# Altium schematic symbol library jlcpcb_2025_04_capacitors_extended_0603.schlib: 3668 symbols (part 20 of 20) (continued)
## TCC0603X7R472K251CT
designator C?  Capacitance: 4700pF  (hidden comment: *)
Capacitor, Ceramic (MLCC), 4700pF, ±10%, 250V, X7R, ±10%, SMD 0603; Manufacturer: CCTC; Manufacturer Part Number: TCC0603X7R472K251CT; Package Size: 0603; JLCPCB Basic Part: No; JLCPCB Part Number: C5375795; Supplier 1: LCSC; Category: Capacitors - MLCC; Supplier Part Number 1: C5375795; Tolerance: ±10%; Voltage Rating: 250V; Temperature Coefficient: X7R; RoHS: Yes; ComponentLink1Description: Datasheet; ComponentLink1URL: https://wmsc.lcsc.com/wmsc/upload/file/pdf/v2/lcsc/2403281708_CCTC-TCC0603X7R472K251CT_C5375795.pdf; ComponentLink2Description: JLCPCB Part URL; ComponentLink2URL: https://jlcpcb.com/partdetail/C5375795; ComponentLink3Description: LCSC Part URL; ComponentLink3URL: https://lcsc.com/product-detail/Multilayer-Ceramic-Capacitors-MLCC---SMD-SMT_CCTC-CCTC-TCC0603X7R472K251CT_C5375795.html
footprint CAP-0603 (0603 (1608M) Capacitor)
pins: 1, 2

## TCC0603X7R472K500CT
designator C?  Capacitance: 4.7nF  (hidden comment: *)
Capacitor, Ceramic (MLCC), 4.7nF, ±10%, 50V, X7R, ±10%, SMD 0603; Manufacturer: CCTC; Manufacturer Part Number: TCC0603X7R472K500CT; Package Size: 0603; JLCPCB Basic Part: No; JLCPCB Part Number: C376837; Supplier 1: LCSC; Category: Capacitors - MLCC; Supplier Part Number 1: C376837; Tolerance: ±10%; Voltage Rating: 50V; Temperature Coefficient: X7R; RoHS: Yes; ComponentLink1Description: Datasheet; ComponentLink1URL: https://wmsc.lcsc.com/wmsc/upload/file/pdf/v2/lcsc/2304140030_CCTC-TCC0603X7R472K500CT_C376837.pdf; ComponentLink2Description: JLCPCB Part URL; ComponentLink2URL: https://jlcpcb.com/partdetail/C376837; ComponentLink3Description: LCSC Part URL; ComponentLink3URL: https://lcsc.com/product-detail/Multilayer-Ceramic-Capacitors-MLCC---SMD-SMT_CCTC-CCTC-TCC0603X7R472K500CT_C376837.html
footprint CAP-0603 (0603 (1608M) Capacitor)
pins: 1, 2

## TCC0603X7R472M500CT
designator C?  Capacitance: 4.7nF  (hidden comment: *)
Capacitor, Ceramic (MLCC), 4.7nF, ±20%, 50V, X7R, ±20%, SMD 0603; Manufacturer: CCTC; Manufacturer Part Number: TCC0603X7R472M500CT; Package Size: 0603; JLCPCB Basic Part: No; JLCPCB Part Number: C696859; Supplier 1: LCSC; Category: Capacitors - MLCC; Supplier Part Number 1: C696859; Tolerance: ±20%; Voltage Rating: 50V; Temperature Coefficient: X7R; RoHS: Yes; ComponentLink1Description: Datasheet; ComponentLink1URL: https://wmsc.lcsc.com/wmsc/upload/file/pdf/v2/lcsc/2304140030_CCTC-TCC0603X7R472M500CT_C696859.pdf; ComponentLink2Description: JLCPCB Part URL; ComponentLink2URL: https://jlcpcb.com/partdetail/C696859; ComponentLink3Description: LCSC Part URL; ComponentLink3URL: https://lcsc.com/product-detail/Multilayer-Ceramic-Capacitors-MLCC---SMD-SMT_CCTC-CCTC-TCC0603X7R472M500CT_C696859.html
footprint CAP-0603 (0603 (1608M) Capacitor)
pins: 1, 2

## TCC0603X7R473K500CT
designator C?  Capacitance: 47nF  (hidden comment: *)
Capacitor, Ceramic (MLCC), 47nF, ±10%, 50V, X7R, ±10%, SMD 0603; Manufacturer: CCTC; Manufacturer Part Number: TCC0603X7R473K500CT; Package Size: 0603; JLCPCB Basic Part: No; JLCPCB Part Number: C282684; Supplier 1: LCSC; Category: Capacitors - MLCC; Supplier Part Number 1: C282684; Tolerance: ±10%; Voltage Rating: 50V; Temperature Coefficient: X7R; RoHS: Yes; ComponentLink1Description: Datasheet; ComponentLink1URL: https://wmsc.lcsc.com/wmsc/upload/file/pdf/v2/lcsc/2304140030_CCTC-TCC0603X7R473K500CT_C282684.pdf; ComponentLink2Description: JLCPCB Part URL; ComponentLink2URL: https://jlcpcb.com/partdetail/C282684; ComponentLink3Description: LCSC Part URL; ComponentLink3URL: https://lcsc.com/product-detail/Multilayer-Ceramic-Capacitors-MLCC---SMD-SMT_CCTC-CCTC-TCC0603X7R473K500CT_C282684.html
footprint CAP-0603 (0603 (1608M) Capacitor)
pins: 1, 2

## TCC0603X7R473M500CT
designator C?  Capacitance: 47nF  (hidden comment: *)
Capacitor, Ceramic (MLCC), 47nF, ±20%, 50V, X7R, ±20%, SMD 0603; Manufacturer: CCTC; Manufacturer Part Number: TCC0603X7R473M500CT; Package Size: 0603; JLCPCB Basic Part: No; JLCPCB Part Number: C696860; Supplier 1: LCSC; Category: Capacitors - MLCC; Supplier Part Number 1: C696860; Tolerance: ±20%; Voltage Rating: 50V; Temperature Coefficient: X7R; RoHS: Yes; ComponentLink1Description: Datasheet; ComponentLink1URL: https://wmsc.lcsc.com/wmsc/upload/file/pdf/v2/lcsc/2304140030_CCTC-TCC0603X7R473M500CT_C696860.pdf; ComponentLink2Description: JLCPCB Part URL; ComponentLink2URL: https://jlcpcb.com/partdetail/C696860; ComponentLink3Description: LCSC Part URL; ComponentLink3URL: https://lcsc.com/product-detail/Multilayer-Ceramic-Capacitors-MLCC---SMD-SMT_CCTC-CCTC-TCC0603X7R473M500CT_C696860.html
footprint CAP-0603 (0603 (1608M) Capacitor)
pins: 1, 2

## TCC0603X7R473M500CTS
designator C?  Capacitance: 47nF  (hidden comment: *)
Capacitor, Ceramic (MLCC), 47nF, ±20%, 50V, X7R, ±20%, SMD 0603; Manufacturer: CCTC; Manufacturer Part Number: TCC0603X7R473M500CTS; Package Size: 0603; JLCPCB Basic Part: No; JLCPCB Part Number: C7393907; Supplier 1: LCSC; Category: Capacitors - MLCC; Supplier Part Number 1: C7393907; Tolerance: ±20%; Voltage Rating: 50V; Temperature Coefficient: X7R; RoHS: Yes; ComponentLink1Description: Datasheet; ComponentLink1URL: https://wmsc.lcsc.com/wmsc/upload/file/pdf/v2/lcsc/2306211554_CCTC-TCC0603X7R473M500CTS_C7393907.pdf; ComponentLink2Description: JLCPCB Part URL; ComponentLink2URL: https://jlcpcb.com/partdetail/C7393907; ComponentLink3Description: LCSC Part URL; ComponentLink3URL: https://lcsc.com/product-detail/Multilayer-Ceramic-Capacitors-MLCC---SMD-SMT_CCTC-CCTC-TCC0603X7R473M500CTS_C7393907.html
footprint CAP-0603 (0603 (1608M) Capacitor)
pins: 1, 2

## TCC0603X7R474K250CT
designator C?  Capacitance: 470nF  (hidden comment: *)
Capacitor, Ceramic (MLCC), 470nF, ±10%, 25V, X7R, ±10%, SMD 0603; Manufacturer: CCTC; Manufacturer Part Number: TCC0603X7R474K250CT; Package Size: 0603; JLCPCB Basic Part: No; JLCPCB Part Number: C376838; Supplier 1: LCSC; Category: Capacitors - MLCC; Supplier Part Number 1: C376838; Tolerance: ±10%; Voltage Rating: 25V; Temperature Coefficient: X7R; RoHS: Yes; ComponentLink1Description: Datasheet; ComponentLink1URL: https://wmsc.lcsc.com/wmsc/upload/file/pdf/v2/lcsc/2304140030_CCTC-TCC0603X7R474K250CT_C376838.pdf; ComponentLink2Description: JLCPCB Part URL; ComponentLink2URL: https://jlcpcb.com/partdetail/C376838; ComponentLink3Description: LCSC Part URL; ComponentLink3URL: https://lcsc.com/product-detail/Multilayer-Ceramic-Capacitors-MLCC---SMD-SMT_CCTC-CCTC-TCC0603X7R474K250CT_C376838.html
footprint CAP-0603 (0603 (1608M) Capacitor)
pins: 1, 2

## TCC0603X7R474K500CT
designator C?  Capacitance: 470nF  (hidden comment: *)
Capacitor, Ceramic (MLCC), 470nF, ±10%, 50V, X7R, ±10%, SMD 0603; Manufacturer: CCTC; Manufacturer Part Number: TCC0603X7R474K500CT; Package Size: 0603; JLCPCB Basic Part: No; JLCPCB Part Number: C376839; Supplier 1: LCSC; Category: Capacitors - MLCC; Supplier Part Number 1: C376839; Tolerance: ±10%; Voltage Rating: 50V; Temperature Coefficient: X7R; RoHS: Yes; ComponentLink1Description: Datasheet; ComponentLink1URL: https://wmsc.lcsc.com/wmsc/upload/file/pdf/v2/lcsc/2304140030_CCTC-TCC0603X7R474K500CT_C376839.pdf; ComponentLink2Description: JLCPCB Part URL; ComponentLink2URL: https://jlcpcb.com/partdetail/C376839; ComponentLink3Description: LCSC Part URL; ComponentLink3URL: https://lcsc.com/product-detail/Multilayer-Ceramic-Capacitors-MLCC---SMD-SMT_CCTC-CCTC-TCC0603X7R474K500CT_C376839.html
footprint CAP-0603 (0603 (1608M) Capacitor)
pins: 1, 2

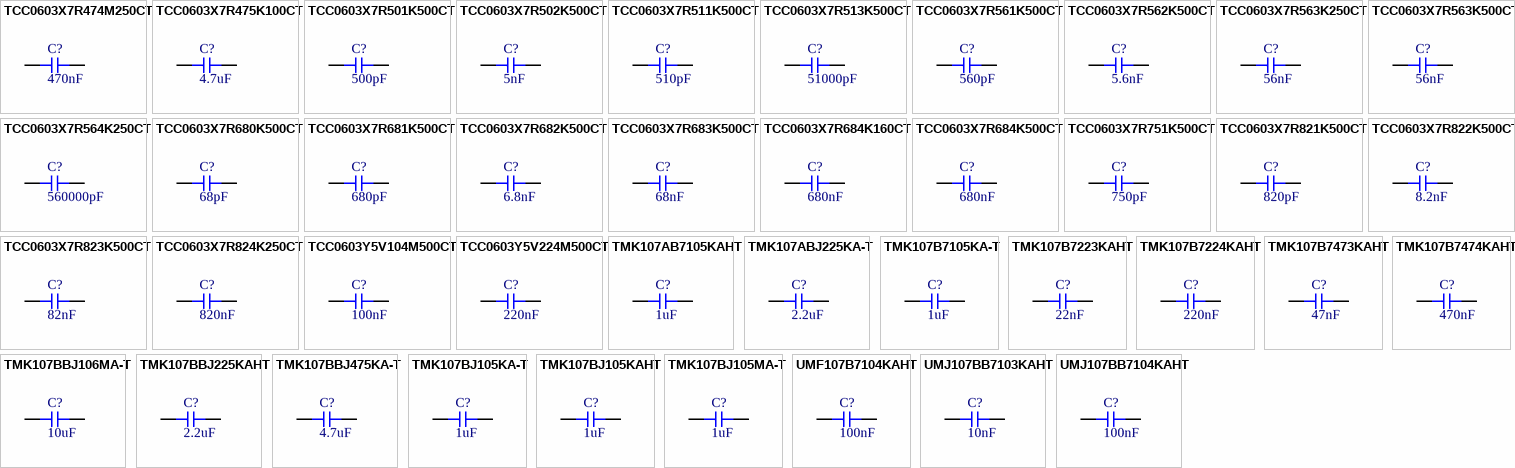
[diagram p89: symbols TCC0603X7R474M250CT to UMJ107BB7104KAHT]

## TCC0603X7R474M250CT
designator C?  Capacitance: 470nF  (hidden comment: *)
Capacitor, Ceramic (MLCC), 470nF, ±20%, 25V, X7R, ±20%, SMD 0603; Manufacturer: CCTC; Manufacturer Part Number: TCC0603X7R474M250CT; Package Size: 0603; JLCPCB Basic Part: No; JLCPCB Part Number: C880617; Supplier 1: LCSC; Category: Capacitors - MLCC; Supplier Part Number 1: C880617; Tolerance: ±20%; Voltage Rating: 25V; Temperature Coefficient: X7R; RoHS: Yes; ComponentLink1Description: Datasheet; ComponentLink1URL: https://wmsc.lcsc.com/wmsc/upload/file/pdf/v2/lcsc/2305171520_CCTC-TCC0603X7R474M250CT_C880617.pdf; ComponentLink2Description: JLCPCB Part URL; ComponentLink2URL: https://jlcpcb.com/partdetail/C880617; ComponentLink3Description: LCSC Part URL; ComponentLink3URL: https://lcsc.com/product-detail/Multilayer-Ceramic-Capacitors-MLCC---SMD-SMT_CCTC-CCTC-TCC0603X7R474M250CT_C880617.html
footprint CAP-0603 (0603 (1608M) Capacitor)
pins: 1, 2

## TCC0603X7R475K100CT
designator C?  Capacitance: 4.7uF  (hidden comment: *)
Capacitor, Ceramic (MLCC), 4.7uF, ±10%, 10V, X7R, ±10%, SMD 0603; Manufacturer: CCTC; Manufacturer Part Number: TCC0603X7R475K100CT; Package Size: 0603; JLCPCB Basic Part: No; JLCPCB Part Number: C18185770; Supplier 1: LCSC; Category: Capacitors - MLCC; Supplier Part Number 1: C18185770; Tolerance: ±10%; Voltage Rating: 10V; Temperature Coefficient: X7R; RoHS: Yes; ComponentLink1Description: Datasheet; ComponentLink1URL: https://wmsc.lcsc.com/wmsc/upload/file/pdf/v2/lcsc/2309181618_CCTC-TCC0603X7R475K100CT_C18185770.pdf; ComponentLink2Description: JLCPCB Part URL; ComponentLink2URL: https://jlcpcb.com/partdetail/C18185770; ComponentLink3Description: LCSC Part URL; ComponentLink3URL: https://lcsc.com/product-detail/Multilayer-Ceramic-Capacitors-MLCC---SMD-SMT_CCTC-CCTC-TCC0603X7R475K100CT_C18185770.html
footprint CAP-0603 (0603 (1608M) Capacitor)
pins: 1, 2

## TCC0603X7R501K500CT
designator C?  Capacitance: 500pF  (hidden comment: *)
Capacitor, Ceramic (MLCC), 500pF, ±10%, 50V, X7R, ±10%, SMD 0603; Manufacturer: CCTC; Manufacturer Part Number: TCC0603X7R501K500CT; Package Size: 0603; JLCPCB Basic Part: No; JLCPCB Part Number: C696904; Supplier 1: LCSC; Category: Capacitors - MLCC; Supplier Part Number 1: C696904; Tolerance: ±10%; Voltage Rating: 50V; Temperature Coefficient: X7R; RoHS: Yes; ComponentLink1Description: Datasheet; ComponentLink1URL: https://wmsc.lcsc.com/wmsc/upload/file/pdf/v2/lcsc/2304140030_CCTC-TCC0603X7R501K500CT_C696904.pdf; ComponentLink2Description: JLCPCB Part URL; ComponentLink2URL: https://jlcpcb.com/partdetail/C696904; ComponentLink3Description: LCSC Part URL; ComponentLink3URL: https://lcsc.com/product-detail/Multilayer-Ceramic-Capacitors-MLCC---SMD-SMT_CCTC-CCTC-TCC0603X7R501K500CT_C696904.html
footprint CAP-0603 (0603 (1608M) Capacitor)
pins: 1, 2

## TCC0603X7R502K500CT
designator C?  Capacitance: 5nF  (hidden comment: *)
Capacitor, Ceramic (MLCC), 5nF, ±10%, 50V, X7R, ±10%, SMD 0603; Manufacturer: CCTC; Manufacturer Part Number: TCC0603X7R502K500CT; Package Size: 0603; JLCPCB Basic Part: No; JLCPCB Part Number: C376840; Supplier 1: LCSC; Category: Capacitors - MLCC; Supplier Part Number 1: C376840; Tolerance: ±10%; Voltage Rating: 50V; Temperature Coefficient: X7R; RoHS: Yes; ComponentLink1Description: Datasheet; ComponentLink1URL: https://wmsc.lcsc.com/wmsc/upload/file/pdf/v2/lcsc/2304140030_CCTC-TCC0603X7R502K500CT_C376840.pdf; ComponentLink2Description: JLCPCB Part URL; ComponentLink2URL: https://jlcpcb.com/partdetail/C376840; ComponentLink3Description: LCSC Part URL; ComponentLink3URL: https://lcsc.com/product-detail/Multilayer-Ceramic-Capacitors-MLCC---SMD-SMT_CCTC-CCTC-TCC0603X7R502K500CT_C376840.html
footprint CAP-0603 (0603 (1608M) Capacitor)
pins: 1, 2

## TCC0603X7R511K500CT
designator C?  Capacitance: 510pF  (hidden comment: *)
Capacitor, Ceramic (MLCC), 510pF, ±10%, 50V, X7R, ±10%, SMD 0603; Manufacturer: CCTC; Manufacturer Part Number: TCC0603X7R511K500CT; Package Size: 0603; JLCPCB Basic Part: No; JLCPCB Part Number: C376841; Supplier 1: LCSC; Category: Capacitors - MLCC; Supplier Part Number 1: C376841; Tolerance: ±10%; Voltage Rating: 50V; Temperature Coefficient: X7R; RoHS: Yes; ComponentLink1Description: Datasheet; ComponentLink1URL: https://wmsc.lcsc.com/wmsc/upload/file/pdf/v2/lcsc/2304140030_CCTC-TCC0603X7R511K500CT_C376841.pdf; ComponentLink2Description: JLCPCB Part URL; ComponentLink2URL: https://jlcpcb.com/partdetail/C376841; ComponentLink3Description: LCSC Part URL; ComponentLink3URL: https://lcsc.com/product-detail/Multilayer-Ceramic-Capacitors-MLCC---SMD-SMT_CCTC-CCTC-TCC0603X7R511K500CT_C376841.html
footprint CAP-0603 (0603 (1608M) Capacitor)
pins: 1, 2

## TCC0603X7R513K500CT
designator C?  Capacitance: 51000pF  (hidden comment: *)
Capacitor, Ceramic (MLCC), 51000pF, ±10%, null, X7R, ±10%, SMD 0603; Manufacturer: CCTC; Manufacturer Part Number: TCC0603X7R513K500CT; Package Size: 0603; JLCPCB Basic Part: No; JLCPCB Part Number: C5360806; Supplier 1: LCSC; Category: Capacitors - MLCC; Supplier Part Number 1: C5360806; Tolerance: ±10%; Voltage Rating: null; Temperature Coefficient: X7R; RoHS: Yes; ComponentLink1Description: Datasheet; ComponentLink1URL: https://wmsc.lcsc.com/wmsc/upload/file/pdf/v2/lcsc/2302141837_CCTC-TCC0603X7R513K500CT_C5360806.pdf; ComponentLink2Description: JLCPCB Part URL; ComponentLink2URL: https://jlcpcb.com/partdetail/C5360806; ComponentLink3Description: LCSC Part URL; ComponentLink3URL: https://lcsc.com/product-detail/Multilayer-Ceramic-Capacitors-MLCC---SMD-SMT_CCTC-CCTC-TCC0603X7R513K500CT_C5360806.html
footprint CAP-0603 (0603 (1608M) Capacitor)
pins: 1, 2

## TCC0603X7R561K500CT
designator C?  Capacitance: 560pF  (hidden comment: *)
Capacitor, Ceramic (MLCC), 560pF, ±10%, 50V, X7R, ±10%, SMD 0603; Manufacturer: CCTC; Manufacturer Part Number: TCC0603X7R561K500CT; Package Size: 0603; JLCPCB Basic Part: No; JLCPCB Part Number: C376842; Supplier 1: LCSC; Category: Capacitors - MLCC; Supplier Part Number 1: C376842; Tolerance: ±10%; Voltage Rating: 50V; Temperature Coefficient: X7R; RoHS: Yes; ComponentLink1Description: Datasheet; ComponentLink1URL: https://wmsc.lcsc.com/wmsc/upload/file/pdf/v2/lcsc/2304140030_CCTC-TCC0603X7R561K500CT_C376842.pdf; ComponentLink2Description: JLCPCB Part URL; ComponentLink2URL: https://jlcpcb.com/partdetail/C376842; ComponentLink3Description: LCSC Part URL; ComponentLink3URL: https://lcsc.com/product-detail/Multilayer-Ceramic-Capacitors-MLCC---SMD-SMT_CCTC-CCTC-TCC0603X7R561K500CT_C376842.html
footprint CAP-0603 (0603 (1608M) Capacitor)
pins: 1, 2

## TCC0603X7R562K500CT
designator C?  Capacitance: 5.6nF  (hidden comment: *)
Capacitor, Ceramic (MLCC), 5.6nF, ±10%, 50V, X7R, ±10%, SMD 0603; Manufacturer: CCTC; Manufacturer Part Number: TCC0603X7R562K500CT; Package Size: 0603; JLCPCB Basic Part: No; JLCPCB Part Number: C282685; Supplier 1: LCSC; Category: Capacitors - MLCC; Supplier Part Number 1: C282685; Tolerance: ±10%; Voltage Rating: 50V; Temperature Coefficient: X7R; RoHS: Yes; ComponentLink1Description: Datasheet; ComponentLink1URL: https://wmsc.lcsc.com/wmsc/upload/file/pdf/v2/lcsc/2304140030_CCTC-TCC0603X7R562K500CT_C282685.pdf; ComponentLink2Description: JLCPCB Part URL; ComponentLink2URL: https://jlcpcb.com/partdetail/C282685; ComponentLink3Description: LCSC Part URL; ComponentLink3URL: https://lcsc.com/product-detail/Multilayer-Ceramic-Capacitors-MLCC---SMD-SMT_CCTC-CCTC-TCC0603X7R562K500CT_C282685.html
footprint CAP-0603 (0603 (1608M) Capacitor)
pins: 1, 2

## TCC0603X7R563K250CT
designator C?  Capacitance: 56nF  (hidden comment: *)
Capacitor, Ceramic (MLCC), 56nF, ±10%, 25V, X7R, ±10%, SMD 0603; Manufacturer: CCTC; Manufacturer Part Number: TCC0603X7R563K250CT; Package Size: 0603; JLCPCB Basic Part: No; JLCPCB Part Number: C376844; Supplier 1: LCSC; Category: Capacitors - MLCC; Supplier Part Number 1: C376844; Tolerance: ±10%; Voltage Rating: 25V; Temperature Coefficient: X7R; RoHS: Yes; ComponentLink1Description: Datasheet; ComponentLink1URL: https://wmsc.lcsc.com/wmsc/upload/file/pdf/v2/lcsc/2304140030_CCTC-TCC0603X7R563K250CT_C376844.pdf; ComponentLink2Description: JLCPCB Part URL; ComponentLink2URL: https://jlcpcb.com/partdetail/C376844; ComponentLink3Description: LCSC Part URL; ComponentLink3URL: https://lcsc.com/product-detail/Multilayer-Ceramic-Capacitors-MLCC---SMD-SMT_CCTC-CCTC-TCC0603X7R563K250CT_C376844.html
footprint CAP-0603 (0603 (1608M) Capacitor)
pins: 1, 2

## TCC0603X7R563K500CT
designator C?  Capacitance: 56nF  (hidden comment: *)
Capacitor, Ceramic (MLCC), 56nF, ±10%, 50V, X7R, ±10%, SMD 0603; Manufacturer: CCTC; Manufacturer Part Number: TCC0603X7R563K500CT; Package Size: 0603; JLCPCB Basic Part: No; JLCPCB Part Number: C309032; Supplier 1: LCSC; Category: Capacitors - MLCC; Supplier Part Number 1: C309032; Tolerance: ±10%; Voltage Rating: 50V; Temperature Coefficient: X7R; RoHS: Yes; ComponentLink1Description: Datasheet; ComponentLink1URL: https://wmsc.lcsc.com/wmsc/upload/file/pdf/v2/lcsc/2304140030_CCTC-TCC0603X7R563K500CT_C309032.pdf; ComponentLink2Description: JLCPCB Part URL; ComponentLink2URL: https://jlcpcb.com/partdetail/C309032; ComponentLink3Description: LCSC Part URL; ComponentLink3URL: https://lcsc.com/product-detail/Multilayer-Ceramic-Capacitors-MLCC---SMD-SMT_CCTC-CCTC-TCC0603X7R563K500CT_C309032.html
footprint CAP-0603 (0603 (1608M) Capacitor)
pins: 1, 2

## TCC0603X7R564K250CT
designator C?  Capacitance: 560000pF  (hidden comment: *)
Capacitor, Ceramic (MLCC), 560000pF, ±10%, 25V, X7R, ±10%, SMD 0603; Manufacturer: CCTC; Manufacturer Part Number: TCC0603X7R564K250CT; Package Size: 0603; JLCPCB Basic Part: No; JLCPCB Part Number: C5360809; Supplier 1: LCSC; Category: Capacitors - MLCC; Supplier Part Number 1: C5360809; Tolerance: ±10%; Voltage Rating: 25V; Temperature Coefficient: X7R; RoHS: Yes; ComponentLink1Description: Datasheet; ComponentLink1URL: https://wmsc.lcsc.com/wmsc/upload/file/pdf/v2/lcsc/2302141837_CCTC-TCC0603X7R564K250CT_C5360809.pdf; ComponentLink2Description: JLCPCB Part URL; ComponentLink2URL: https://jlcpcb.com/partdetail/C5360809; ComponentLink3Description: LCSC Part URL; ComponentLink3URL: https://lcsc.com/product-detail/Multilayer-Ceramic-Capacitors-MLCC---SMD-SMT_CCTC-CCTC-TCC0603X7R564K250CT_C5360809.html
footprint CAP-0603 (0603 (1608M) Capacitor)
pins: 1, 2

## TCC0603X7R680K500CT
designator C?  Capacitance: 68pF  (hidden comment: *)
Capacitor, Ceramic (MLCC), 68pF, ±10%, 50V, X7R, ±10%, SMD 0603; Manufacturer: CCTC; Manufacturer Part Number: TCC0603X7R680K500CT; Package Size: 0603; JLCPCB Basic Part: No; JLCPCB Part Number: C376845; Supplier 1: LCSC; Category: Capacitors - MLCC; Supplier Part Number 1: C376845; Tolerance: ±10%; Voltage Rating: 50V; Temperature Coefficient: X7R; RoHS: Yes; ComponentLink1Description: Datasheet; ComponentLink1URL: https://wmsc.lcsc.com/wmsc/upload/file/pdf/v2/lcsc/2304140030_CCTC-TCC0603X7R680K500CT_C376845.pdf; ComponentLink2Description: JLCPCB Part URL; ComponentLink2URL: https://jlcpcb.com/partdetail/C376845; ComponentLink3Description: LCSC Part URL; ComponentLink3URL: https://lcsc.com/product-detail/Multilayer-Ceramic-Capacitors-MLCC---SMD-SMT_CCTC-CCTC-TCC0603X7R680K500CT_C376845.html
footprint CAP-0603 (0603 (1608M) Capacitor)
pins: 1, 2

## TCC0603X7R681K500CT
designator C?  Capacitance: 680pF  (hidden comment: *)
Capacitor, Ceramic (MLCC), 680pF, ±10%, 50V, X7R, ±10%, SMD 0603; Manufacturer: CCTC; Manufacturer Part Number: TCC0603X7R681K500CT; Package Size: 0603; JLCPCB Basic Part: No; JLCPCB Part Number: C282687; Supplier 1: LCSC; Category: Capacitors - MLCC; Supplier Part Number 1: C282687; Tolerance: ±10%; Voltage Rating: 50V; Temperature Coefficient: X7R; RoHS: Yes; ComponentLink1Description: Datasheet; ComponentLink1URL: https://wmsc.lcsc.com/wmsc/upload/file/pdf/v2/lcsc/2304140030_CCTC-TCC0603X7R681K500CT_C282687.pdf; ComponentLink2Description: JLCPCB Part URL; ComponentLink2URL: https://jlcpcb.com/partdetail/C282687; ComponentLink3Description: LCSC Part URL; ComponentLink3URL: https://lcsc.com/product-detail/Multilayer-Ceramic-Capacitors-MLCC---SMD-SMT_CCTC-CCTC-TCC0603X7R681K500CT_C282687.html
footprint CAP-0603 (0603 (1608M) Capacitor)
pins: 1, 2

## TCC0603X7R682K500CT
designator C?  Capacitance: 6.8nF  (hidden comment: *)
Capacitor, Ceramic (MLCC), 6.8nF, ±10%, 50V, X7R, ±10%, SMD 0603; Manufacturer: CCTC; Manufacturer Part Number: TCC0603X7R682K500CT; Package Size: 0603; JLCPCB Basic Part: No; JLCPCB Part Number: C282688; Supplier 1: LCSC; Category: Capacitors - MLCC; Supplier Part Number 1: C282688; Tolerance: ±10%; Voltage Rating: 50V; Temperature Coefficient: X7R; RoHS: Yes; ComponentLink1Description: Datasheet; ComponentLink1URL: https://wmsc.lcsc.com/wmsc/upload/file/pdf/v2/lcsc/2304140030_CCTC-TCC0603X7R682K500CT_C282688.pdf; ComponentLink2Description: JLCPCB Part URL; ComponentLink2URL: https://jlcpcb.com/partdetail/C282688; ComponentLink3Description: LCSC Part URL; ComponentLink3URL: https://lcsc.com/product-detail/Multilayer-Ceramic-Capacitors-MLCC---SMD-SMT_CCTC-CCTC-TCC0603X7R682K500CT_C282688.html
footprint CAP-0603 (0603 (1608M) Capacitor)
pins: 1, 2

## TCC0603X7R683K500CT
designator C?  Capacitance: 68nF  (hidden comment: *)
Capacitor, Ceramic (MLCC), 68nF, ±10%, 50V, X7R, ±10%, SMD 0603; Manufacturer: CCTC; Manufacturer Part Number: TCC0603X7R683K500CT; Package Size: 0603; JLCPCB Basic Part: No; JLCPCB Part Number: C309033; Supplier 1: LCSC; Category: Capacitors - MLCC; Supplier Part Number 1: C309033; Tolerance: ±10%; Voltage Rating: 50V; Temperature Coefficient: X7R; RoHS: Yes; ComponentLink1Description: Datasheet; ComponentLink1URL: https://wmsc.lcsc.com/wmsc/upload/file/pdf/v2/lcsc/2304140030_CCTC-TCC0603X7R683K500CT_C309033.pdf; ComponentLink2Description: JLCPCB Part URL; ComponentLink2URL: https://jlcpcb.com/partdetail/C309033; ComponentLink3Description: LCSC Part URL; ComponentLink3URL: https://lcsc.com/product-detail/Multilayer-Ceramic-Capacitors-MLCC---SMD-SMT_CCTC-CCTC-TCC0603X7R683K500CT_C309033.html
footprint CAP-0603 (0603 (1608M) Capacitor)
pins: 1, 2

## TCC0603X7R684K160CT
designator C?  Capacitance: 680nF  (hidden comment: *)
Capacitor, Ceramic (MLCC), 680nF, ±10%, 16V, X7R, ±10%, SMD 0603; Manufacturer: CCTC; Manufacturer Part Number: TCC0603X7R684K160CT; Package Size: 0603; JLCPCB Basic Part: No; JLCPCB Part Number: C376846; Supplier 1: LCSC; Category: Capacitors - MLCC; Supplier Part Number 1: C376846; Tolerance: ±10%; Voltage Rating: 16V; Temperature Coefficient: X7R; RoHS: Yes; ComponentLink1Description: Datasheet; ComponentLink1URL: https://wmsc.lcsc.com/wmsc/upload/file/pdf/v2/lcsc/2304140030_CCTC-TCC0603X7R684K160CT_C376846.pdf; ComponentLink2Description: JLCPCB Part URL; ComponentLink2URL: https://jlcpcb.com/partdetail/C376846; ComponentLink3Description: LCSC Part URL; ComponentLink3URL: https://lcsc.com/product-detail/Multilayer-Ceramic-Capacitors-MLCC---SMD-SMT_CCTC-CCTC-TCC0603X7R684K160CT_C376846.html
footprint CAP-0603 (0603 (1608M) Capacitor)
pins: 1, 2

## TCC0603X7R684K500CT
designator C?  Capacitance: 680nF  (hidden comment: *)
Capacitor, Ceramic (MLCC), 680nF, ±10%, null, X7R, ±10%, SMD 0603; Manufacturer: CCTC; Manufacturer Part Number: TCC0603X7R684K500CT; Package Size: 0603; JLCPCB Basic Part: No; JLCPCB Part Number: C5360852; Supplier 1: LCSC; Category: Capacitors - MLCC; Supplier Part Number 1: C5360852; Tolerance: ±10%; Voltage Rating: null; Temperature Coefficient: X7R; RoHS: Yes; ComponentLink1Description: Datasheet; ComponentLink1URL: https://wmsc.lcsc.com/wmsc/upload/file/pdf/v2/lcsc/2302141837_CCTC-TCC0603X7R684K500CT_C5360852.pdf; ComponentLink2Description: JLCPCB Part URL; ComponentLink2URL: https://jlcpcb.com/partdetail/C5360852; ComponentLink3Description: LCSC Part URL; ComponentLink3URL: https://lcsc.com/product-detail/Multilayer-Ceramic-Capacitors-MLCC---SMD-SMT_CCTC-CCTC-TCC0603X7R684K500CT_C5360852.html
footprint CAP-0603 (0603 (1608M) Capacitor)
pins: 1, 2

## TCC0603X7R751K500CT
designator C?  Capacitance: 750pF  (hidden comment: *)
Capacitor, Ceramic (MLCC), 750pF, ±10%, 50V, X7R, ±10%, SMD 0603; Manufacturer: CCTC; Manufacturer Part Number: TCC0603X7R751K500CT; Package Size: 0603; JLCPCB Basic Part: No; JLCPCB Part Number: C376847; Supplier 1: LCSC; Category: Capacitors - MLCC; Supplier Part Number 1: C376847; Tolerance: ±10%; Voltage Rating: 50V; Temperature Coefficient: X7R; RoHS: Yes; ComponentLink1Description: Datasheet; ComponentLink1URL: https://wmsc.lcsc.com/wmsc/upload/file/pdf/v2/lcsc/2304140030_CCTC-TCC0603X7R751K500CT_C376847.pdf; ComponentLink2Description: JLCPCB Part URL; ComponentLink2URL: https://jlcpcb.com/partdetail/C376847; ComponentLink3Description: LCSC Part URL; ComponentLink3URL: https://lcsc.com/product-detail/Multilayer-Ceramic-Capacitors-MLCC---SMD-SMT_CCTC-CCTC-TCC0603X7R751K500CT_C376847.html
footprint CAP-0603 (0603 (1608M) Capacitor)
pins: 1, 2

## TCC0603X7R821K500CT
designator C?  Capacitance: 820pF  (hidden comment: *)
Capacitor, Ceramic (MLCC), 820pF, ±10%, 50V, X7R, ±10%, SMD 0603; Manufacturer: CCTC; Manufacturer Part Number: TCC0603X7R821K500CT; Package Size: 0603; JLCPCB Basic Part: No; JLCPCB Part Number: C376848; Supplier 1: LCSC; Category: Capacitors - MLCC; Supplier Part Number 1: C376848; Tolerance: ±10%; Voltage Rating: 50V; Temperature Coefficient: X7R; RoHS: Yes; ComponentLink1Description: Datasheet; ComponentLink1URL: https://wmsc.lcsc.com/wmsc/upload/file/pdf/v2/lcsc/2304140030_CCTC-TCC0603X7R821K500CT_C376848.pdf; ComponentLink2Description: JLCPCB Part URL; ComponentLink2URL: https://jlcpcb.com/partdetail/C376848; ComponentLink3Description: LCSC Part URL; ComponentLink3URL: https://lcsc.com/product-detail/Multilayer-Ceramic-Capacitors-MLCC---SMD-SMT_CCTC-CCTC-TCC0603X7R821K500CT_C376848.html
footprint CAP-0603 (0603 (1608M) Capacitor)
pins: 1, 2

## TCC0603X7R822K500CT
designator C?  Capacitance: 8.2nF  (hidden comment: *)
Capacitor, Ceramic (MLCC), 8.2nF, ±10%, 50V, X7R, ±10%, SMD 0603; Manufacturer: CCTC; Manufacturer Part Number: TCC0603X7R822K500CT; Package Size: 0603; JLCPCB Basic Part: No; JLCPCB Part Number: C376849; Supplier 1: LCSC; Category: Capacitors - MLCC; Supplier Part Number 1: C376849; Tolerance: ±10%; Voltage Rating: 50V; Temperature Coefficient: X7R; RoHS: Yes; ComponentLink1Description: Datasheet; ComponentLink1URL: https://wmsc.lcsc.com/wmsc/upload/file/pdf/v2/lcsc/2304140030_CCTC-TCC0603X7R822K500CT_C376849.pdf; ComponentLink2Description: JLCPCB Part URL; ComponentLink2URL: https://jlcpcb.com/partdetail/C376849; ComponentLink3Description: LCSC Part URL; ComponentLink3URL: https://lcsc.com/product-detail/Multilayer-Ceramic-Capacitors-MLCC---SMD-SMT_CCTC-CCTC-TCC0603X7R822K500CT_C376849.html
footprint CAP-0603 (0603 (1608M) Capacitor)
pins: 1, 2

## TCC0603X7R823K500CT
designator C?  Capacitance: 82nF  (hidden comment: *)
Capacitor, Ceramic (MLCC), 82nF, ±10%, 50V, X7R, ±10%, SMD 0603; Manufacturer: CCTC; Manufacturer Part Number: TCC0603X7R823K500CT; Package Size: 0603; JLCPCB Basic Part: No; JLCPCB Part Number: C376850; Supplier 1: LCSC; Category: Capacitors - MLCC; Supplier Part Number 1: C376850; Tolerance: ±10%; Voltage Rating: 50V; Temperature Coefficient: X7R; RoHS: Yes; ComponentLink1Description: Datasheet; ComponentLink1URL: https://wmsc.lcsc.com/wmsc/upload/file/pdf/v2/lcsc/2304140030_CCTC-TCC0603X7R823K500CT_C376850.pdf; ComponentLink2Description: JLCPCB Part URL; ComponentLink2URL: https://jlcpcb.com/partdetail/C376850; ComponentLink3Description: LCSC Part URL; ComponentLink3URL: https://lcsc.com/product-detail/Multilayer-Ceramic-Capacitors-MLCC---SMD-SMT_CCTC-CCTC-TCC0603X7R823K500CT_C376850.html
footprint CAP-0603 (0603 (1608M) Capacitor)
pins: 1, 2

## TCC0603X7R824K250CT
designator C?  Capacitance: 820nF  (hidden comment: *)
Capacitor, Ceramic (MLCC), 820nF, ±10%, 25V, X7R, ±10%, SMD 0603; Manufacturer: CCTC; Manufacturer Part Number: TCC0603X7R824K250CT; Package Size: 0603; JLCPCB Basic Part: No; JLCPCB Part Number: C5360807; Supplier 1: LCSC; Category: Capacitors - MLCC; Supplier Part Number 1: C5360807; Tolerance: ±10%; Voltage Rating: 25V; Temperature Coefficient: X7R; RoHS: Yes; ComponentLink1Description: Datasheet; ComponentLink1URL: https://wmsc.lcsc.com/wmsc/upload/file/pdf/v2/lcsc/2302141837_CCTC-TCC0603X7R824K250CT_C5360807.pdf; ComponentLink2Description: JLCPCB Part URL; ComponentLink2URL: https://jlcpcb.com/partdetail/C5360807; ComponentLink3Description: LCSC Part URL; ComponentLink3URL: https://lcsc.com/product-detail/Multilayer-Ceramic-Capacitors-MLCC---SMD-SMT_CCTC-CCTC-TCC0603X7R824K250CT_C5360807.html
footprint CAP-0603 (0603 (1608M) Capacitor)
pins: 1, 2

## TCC0603Y5V104M500CT
designator C?  Capacitance: 100nF  (hidden comment: *)
Capacitor, Ceramic (MLCC), 100nF, ±20%, 50V, Y5V, ±20%, SMD 0603; Manufacturer: CCTC; Manufacturer Part Number: TCC0603Y5V104M500CT; Package Size: 0603; JLCPCB Basic Part: No; JLCPCB Part Number: C376851; Supplier 1: LCSC; Category: Capacitors - MLCC; Supplier Part Number 1: C376851; Tolerance: ±20%; Voltage Rating: 50V; Temperature Coefficient: Y5V; RoHS: Yes; ComponentLink1Description: Datasheet; ComponentLink1URL: https://wmsc.lcsc.com/wmsc/upload/file/pdf/v2/lcsc/2304140030_CCTC-TCC0603Y5V104M500CT_C376851.pdf; ComponentLink2Description: JLCPCB Part URL; ComponentLink2URL: https://jlcpcb.com/partdetail/C376851; ComponentLink3Description: LCSC Part URL; ComponentLink3URL: https://lcsc.com/product-detail/Multilayer-Ceramic-Capacitors-MLCC---SMD-SMT_CCTC-CCTC-TCC0603Y5V104M500CT_C376851.html
footprint CAP-0603 (0603 (1608M) Capacitor)
pins: 1, 2

## TCC0603Y5V224M500CT
designator C?  Capacitance: 220nF  (hidden comment: *)
Capacitor, Ceramic (MLCC), 220nF, ±20%, 50V, Y5V, ±20%, SMD 0603; Manufacturer: CCTC; Manufacturer Part Number: TCC0603Y5V224M500CT; Package Size: 0603; JLCPCB Basic Part: No; JLCPCB Part Number: C713509; Supplier 1: LCSC; Category: Capacitors - MLCC; Supplier Part Number 1: C713509; Tolerance: ±20%; Voltage Rating: 50V; Temperature Coefficient: Y5V; RoHS: Yes; ComponentLink1Description: Datasheet; ComponentLink1URL: https://wmsc.lcsc.com/wmsc/upload/file/pdf/v2/lcsc/2304140030_CCTC-TCC0603Y5V224M500CT_C713509.pdf; ComponentLink2Description: JLCPCB Part URL; ComponentLink2URL: https://jlcpcb.com/partdetail/C713509; ComponentLink3Description: LCSC Part URL; ComponentLink3URL: https://lcsc.com/product-detail/Multilayer-Ceramic-Capacitors-MLCC---SMD-SMT_CCTC-CCTC-TCC0603Y5V224M500CT_C713509.html
footprint CAP-0603 (0603 (1608M) Capacitor)
pins: 1, 2

## TMK107AB7105KAHT
designator C?  Capacitance: 1uF  (hidden comment: *)
Capacitor, Ceramic (MLCC), 1uF, ±10%, 25V, X7R, ±10%, SMD 0603; Manufacturer: Taiyo Yuden; Manufacturer Part Number: TMK107AB7105KAHT; Package Size: 0603; JLCPCB Basic Part: No; JLCPCB Part Number: C386079; Supplier 1: LCSC; Category: Capacitors - MLCC; Supplier Part Number 1: C386079; Tolerance: ±10%; Voltage Rating: 25V; Temperature Coefficient: X7R; RoHS: Yes; ComponentLink1Description: Datasheet; ComponentLink1URL: https://wmsc.lcsc.com/wmsc/upload/file/pdf/v2/lcsc/1912111437_Taiyo-Yuden-TMK107AB7105KAHT_C386079.pdf; ComponentLink2Description: JLCPCB Part URL; ComponentLink2URL: https://jlcpcb.com/partdetail/C386079; ComponentLink3Description: LCSC Part URL; ComponentLink3URL: https://lcsc.com/product-detail/Multilayer-Ceramic-Capacitors-MLCC---SMD-SMT_Taiyo-Yuden-Taiyo-Yuden-TMK107AB7105KAHT_C386079.html
footprint CAP-0603 (0603 (1608M) Capacitor)
pins: 1, 2

## TMK107ABJ225KA-T
designator C?  Capacitance: 2.2uF  (hidden comment: *)
Capacitor, Ceramic (MLCC), 2.2uF, ±10%, 25V, X5R, ±10%, SMD 0603; Manufacturer: Taiyo Yuden; Manufacturer Part Number: TMK107ABJ225KA-T; Package Size: 0603; JLCPCB Basic Part: No; JLCPCB Part Number: C268022; Supplier 1: LCSC; Category: Capacitors - MLCC; Supplier Part Number 1: C268022; Tolerance: ±10%; Voltage Rating: 25V; Temperature Coefficient: X5R; RoHS: Yes; ComponentLink1Description: Datasheet; ComponentLink1URL: https://wmsc.lcsc.com/wmsc/upload/file/pdf/v2/lcsc/1810171820_Taiyo-Yuden-TMK107ABJ225KA-T_C268022.pdf; ComponentLink2Description: JLCPCB Part URL; ComponentLink2URL: https://jlcpcb.com/partdetail/C268022; ComponentLink3Description: LCSC Part URL; ComponentLink3URL: https://lcsc.com/product-detail/Multilayer-Ceramic-Capacitors-MLCC---SMD-SMT_Taiyo-Yuden-Taiyo-Yuden-TMK107ABJ225KA-T_C268022.html
footprint CAP-0603 (0603 (1608M) Capacitor)
pins: 1, 2

## TMK107B7105KA-T
designator C?  Capacitance: 1uF  (hidden comment: *)
Capacitor, Ceramic (MLCC), 1uF, ±10%, 25V, X7R, ±10%, SMD 0603; Manufacturer: Taiyo Yuden; Manufacturer Part Number: TMK107B7105KA-T; Package Size: 0603; JLCPCB Basic Part: No; JLCPCB Part Number: C92827; Supplier 1: LCSC; Category: Capacitors - MLCC; Supplier Part Number 1: C92827; Tolerance: ±10%; Voltage Rating: 25V; Temperature Coefficient: X7R; RoHS: Yes; ComponentLink1Description: Datasheet; ComponentLink1URL: https://wmsc.lcsc.com/wmsc/upload/file/pdf/v2/lcsc/1811110911_Taiyo-Yuden-TMK107B7105KA-T_C92827.pdf; ComponentLink2Description: JLCPCB Part URL; ComponentLink2URL: https://jlcpcb.com/partdetail/C92827; ComponentLink3Description: LCSC Part URL; ComponentLink3URL: https://lcsc.com/product-detail/Multilayer-Ceramic-Capacitors-MLCC---SMD-SMT_Taiyo-Yuden-Taiyo-Yuden-TMK107B7105KA-T_C92827.html
footprint CAP-0603 (0603 (1608M) Capacitor)
pins: 1, 2

## TMK107B7223KAHT
designator C?  Capacitance: 22nF  (hidden comment: *)
Capacitor, Ceramic (MLCC), 22nF, ±10%, 25V, X7R, ±10%, SMD 0603; Manufacturer: Taiyo Yuden; Manufacturer Part Number: TMK107B7223KAHT; Package Size: 0603; JLCPCB Basic Part: No; JLCPCB Part Number: C454114; Supplier 1: LCSC; Category: Capacitors - MLCC; Supplier Part Number 1: C454114; Tolerance: ±10%; Voltage Rating: 25V; Temperature Coefficient: X7R; RoHS: Yes; ComponentLink1Description: Datasheet; ComponentLink1URL: https://wmsc.lcsc.com/wmsc/upload/file/pdf/v2/lcsc/2304140030_Taiyo-Yuden-TMK107B7223KAHT_C454114.pdf; ComponentLink2Description: JLCPCB Part URL; ComponentLink2URL: https://jlcpcb.com/partdetail/C454114; ComponentLink3Description: LCSC Part URL; ComponentLink3URL: https://lcsc.com/product-detail/Multilayer-Ceramic-Capacitors-MLCC---SMD-SMT_Taiyo-Yuden-Taiyo-Yuden-TMK107B7223KAHT_C454114.html
footprint CAP-0603 (0603 (1608M) Capacitor)
pins: 1, 2

## TMK107B7224KAHT
designator C?  Capacitance: 220nF  (hidden comment: *)
Capacitor, Ceramic (MLCC), 220nF, ±10%, 25V, X7R, ±10%, SMD 0603; Manufacturer: Taiyo Yuden; Manufacturer Part Number: TMK107B7224KAHT; Package Size: 0603; JLCPCB Basic Part: No; JLCPCB Part Number: C454115; Supplier 1: LCSC; Category: Capacitors - MLCC; Supplier Part Number 1: C454115; Tolerance: ±10%; Voltage Rating: 25V; Temperature Coefficient: X7R; RoHS: Yes; ComponentLink1Description: Datasheet; ComponentLink1URL: https://wmsc.lcsc.com/wmsc/upload/file/pdf/v2/lcsc/2211282230_Taiyo-Yuden-TMK107B7224KAHT_C454115.pdf; ComponentLink2Description: JLCPCB Part URL; ComponentLink2URL: https://jlcpcb.com/partdetail/C454115; ComponentLink3Description: LCSC Part URL; ComponentLink3URL: https://lcsc.com/product-detail/Multilayer-Ceramic-Capacitors-MLCC---SMD-SMT_Taiyo-Yuden-Taiyo-Yuden-TMK107B7224KAHT_C454115.html
footprint CAP-0603 (0603 (1608M) Capacitor)
pins: 1, 2

## TMK107B7473KAHT
designator C?  Capacitance: 47nF  (hidden comment: *)
Capacitor, Ceramic (MLCC), 47nF, ±10%, 25V, X7R, ±10%, SMD 0603; Manufacturer: Taiyo Yuden; Manufacturer Part Number: TMK107B7473KAHT; Package Size: 0603; JLCPCB Basic Part: No; JLCPCB Part Number: C650983; Supplier 1: LCSC; Category: Capacitors - MLCC; Supplier Part Number 1: C650983; Tolerance: ±10%; Voltage Rating: 25V; Temperature Coefficient: X7R; RoHS: Yes; ComponentLink1Description: Datasheet; ComponentLink1URL: https://wmsc.lcsc.com/wmsc/upload/file/pdf/v2/lcsc/2211282200_Taiyo-Yuden-TMK107B7473KAHT_C650983.pdf; ComponentLink2Description: JLCPCB Part URL; ComponentLink2URL: https://jlcpcb.com/partdetail/C650983; ComponentLink3Description: LCSC Part URL; ComponentLink3URL: https://lcsc.com/product-detail/Multilayer-Ceramic-Capacitors-MLCC---SMD-SMT_Taiyo-Yuden-Taiyo-Yuden-TMK107B7473KAHT_C650983.html
footprint CAP-0603 (0603 (1608M) Capacitor)
pins: 1, 2

## TMK107B7474KAHT
designator C?  Capacitance: 470nF  (hidden comment: *)
Capacitor, Ceramic (MLCC), 470nF, ±10%, 25V, X7R, ±10%, SMD 0603; Manufacturer: Taiyo Yuden; Manufacturer Part Number: TMK107B7474KAHT; Package Size: 0603; JLCPCB Basic Part: No; JLCPCB Part Number: C650973; Supplier 1: LCSC; Category: Capacitors - MLCC; Supplier Part Number 1: C650973; Tolerance: ±10%; Voltage Rating: 25V; Temperature Coefficient: X7R; RoHS: Yes; ComponentLink1Description: Datasheet; ComponentLink1URL: https://wmsc.lcsc.com/wmsc/upload/file/pdf/v2/lcsc/2211282200_Taiyo-Yuden-TMK107B7474KAHT_C650973.pdf; ComponentLink2Description: JLCPCB Part URL; ComponentLink2URL: https://jlcpcb.com/partdetail/C650973; ComponentLink3Description: LCSC Part URL; ComponentLink3URL: https://lcsc.com/product-detail/Multilayer-Ceramic-Capacitors-MLCC---SMD-SMT_Taiyo-Yuden-Taiyo-Yuden-TMK107B7474KAHT_C650973.html
footprint CAP-0603 (0603 (1608M) Capacitor)
pins: 1, 2
